# Altium footprint library terminal_blocks.PcbLib: 74 footprints (part 1 of 5)
Each footprint in its own frame and in the unit in brackets; x right, y up, seen from the top. Pads: shape width x height; smd on the part's side, far side on the other; paste and mask are expansions set on the pad; w line width, h text height; cw(c..) or ccw(c..) is an arc to the next point about the centre after c.
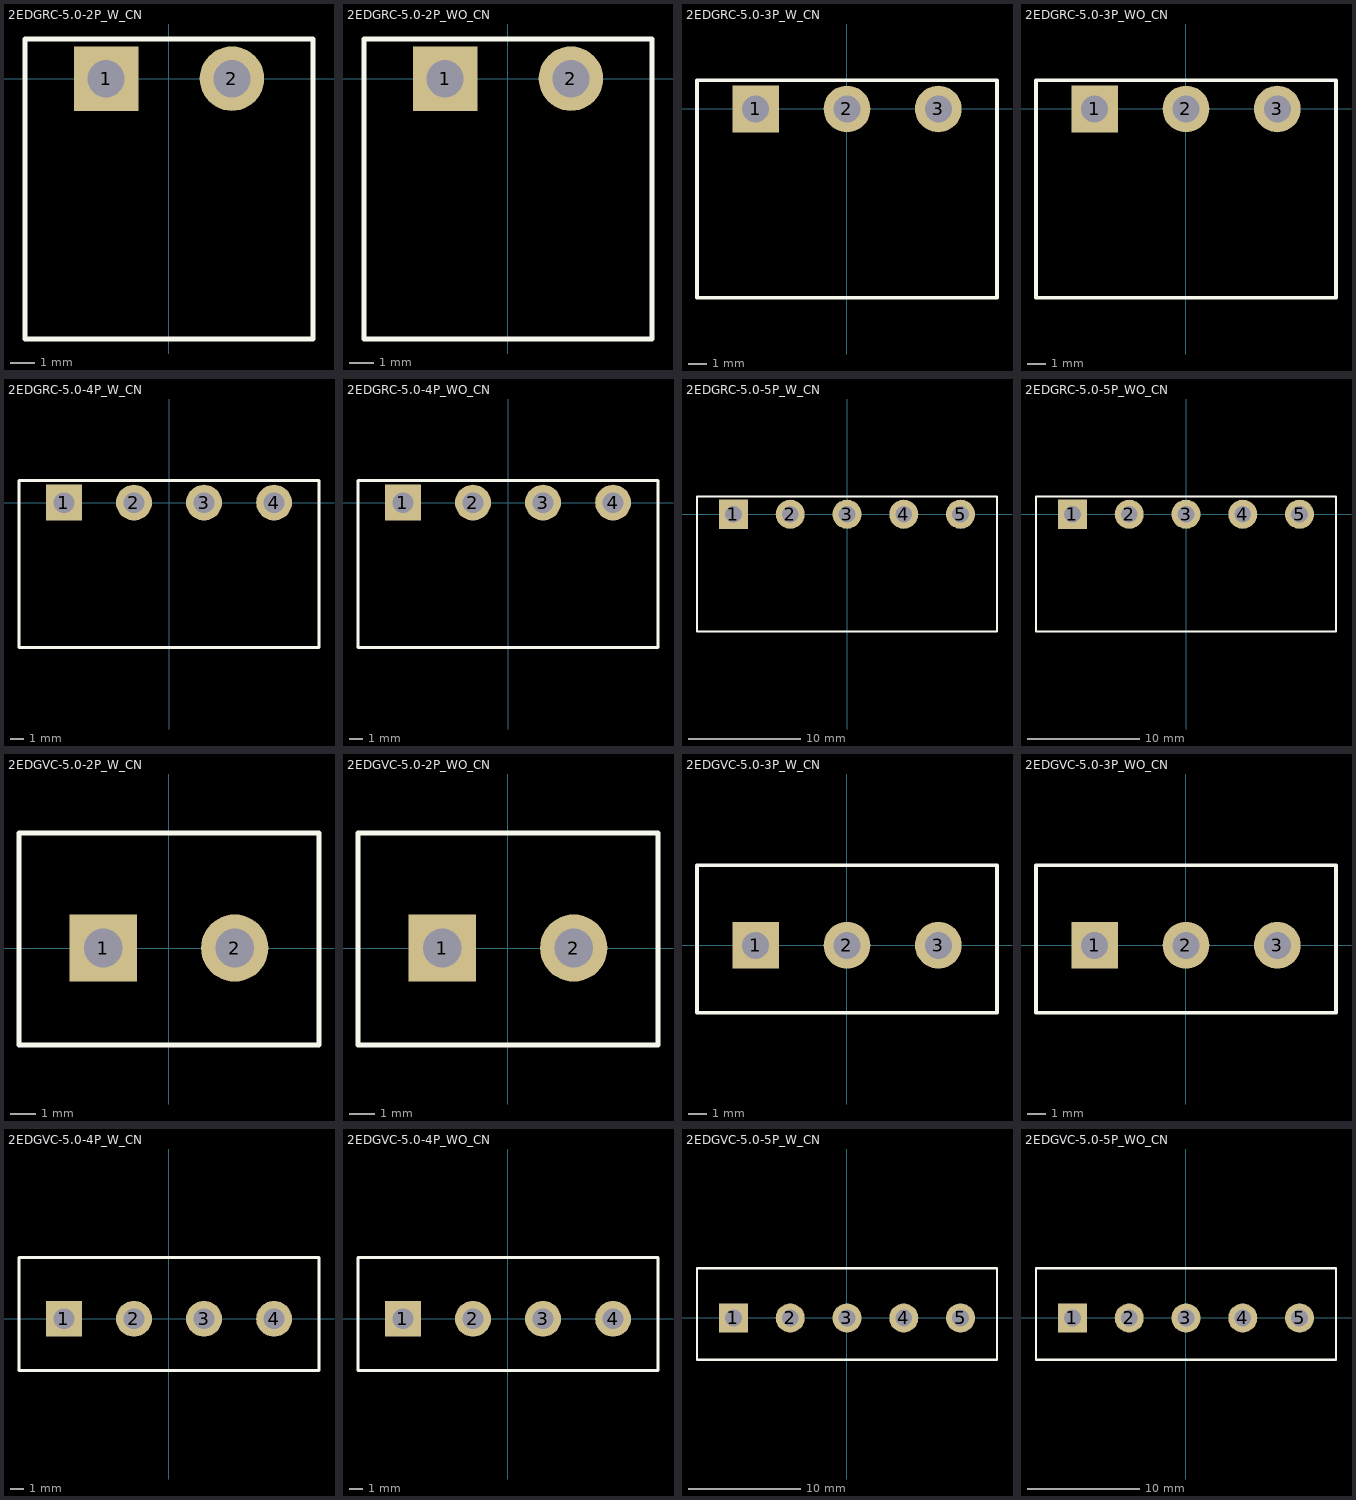
[diagram p0: the footprints below, top view; thin cyan lines are the x and y axes]

## 2EDGRC-5.0-2P_W_CN [mm] "Degson 20A, 320V, 2 Pole Plug-in Terminal Block"
height 8.2
pads (2):
  rect 2.6x2.6 hole 1.5: 1(-2.54,0)
  round 2.6 hole 1.5: 2(2.54,0)
Top Overlay:
  lines w0.2: -5.8,-10.5 5.8,-10.5 5.8,1.6 -5.8,1.6 -5.8,-10.5
3D body "2EDG-5.08-02P__.STEP": height 15.31, standoff 0.21, extent -5.08,-19.63 5.08,-2.3
3D body "ndz6.STEP": height 8.2, standoff -2.12, extent -5.78,-10.5 5.78,1.6

## 2EDGRC-5.0-2P_WO_CN [mm] "Degson 20A, 320V, 2 Pole Plug-in Terminal Block"
height 8.2
pads (2):
  rect 2.6x2.6 hole 1.5: 1(-2.54,0)
  round 2.6 hole 1.5: 2(2.54,0)
Top Overlay:
  lines w0.2: -5.8,-10.5 5.8,-10.5 5.8,1.6 -5.8,1.6 -5.8,-10.5
3D body "ndz6.STEP": height 8.2, standoff -2.12, extent -5.76,-10.5 5.8,1.6

## 2EDGRC-5.0-3P_W_CN [mm] "Degson 20A, 320V, 3 Pole Plug-in Terminal Block"
height 8.2
pads (3):
  rect 2.6x2.6 hole 1.5: 1(-5.08,0)
  round 2.6 hole 1.5: 2(0,0) 3(5.08,0)
Top Overlay:
  lines w0.2: -8.34,-10.5 8.34,-10.5 8.34,1.6 -8.34,1.6 -8.34,-10.5
3D body "Czêœæ23.STEP": height 8.2, standoff -3.12, extent -8.32,-10.5 8.32,1.6
3D body "2EDG-5.08-03P__.STEP": height 15.31, standoff 0.21, extent -7.62,-19.63 7.62,-2.3

## 2EDGRC-5.0-3P_WO_CN [mm] "Degson 20A, 320V, 3 Pole Plug-in Terminal Block"
height 8.2
pads (3):
  rect 2.6x2.6 hole 1.5: 1(-5.08,0)
  round 2.6 hole 1.5: 2(0,0) 3(5.08,0)
Top Overlay:
  lines w0.2: -8.34,-10.5 -8.34,1.6 8.34,1.6 8.34,-10.5 -8.34,-10.5
3D body "Czêœæ23.STEP": height 8.2, standoff -3.12, extent -8.32,-10.5 8.32,1.6

## 2EDGRC-5.0-4P_W_CN [mm] "Degson 20A, 320V, 4 Pole Plug-in Terminal Block"
height 8.2
pads (4):
  rect 2.6x2.6 hole 1.5: 1(-7.62,0)
  round 2.6 hole 1.5: 2(-2.54,0) 3(2.54,0) 4(7.62,0)
Top Overlay:
  lines w0.2: -10.88,-10.5 10.88,-10.5 10.88,1.6 -10.88,1.6 -10.88,-10.5
3D body "2EDG-5.08-04P__.STEP": height 15.31, standoff 0.21, extent -10.16,-19.63 10.16,-2.3
3D body "Czesc.STEP": height 8.44, standoff -3.12, extent -10.86,-10.5 10.86,1.6

## 2EDGRC-5.0-4P_WO_CN [mm] "Degson 20A, 320V, 4 Pole Plug-in Terminal Block"
height 8.2
pads (4):
  rect 2.6x2.6 hole 1.5: 1(-7.62,0)
  round 2.6 hole 1.5: 2(-2.54,0) 3(2.54,0) 4(7.62,0)
Top Overlay:
  lines w0.2: -10.88,-10.5 -10.88,1.6 10.88,1.6 10.88,-10.5 -10.88,-10.5
3D body "Czesc.STEP": height 8.44, standoff -3.12, extent -10.86,-10.5 10.86,1.6

## 2EDGRC-5.0-5P_W_CN [mm] "Degson 20A, 320V, 5 Pole Plug-in Terminal Block"
height 8.2
pads (5):
  rect 2.6x2.6 hole 1.5: 1(-10.16,0)
  round 2.6 hole 1.5: 2(-5.08,0) 3(0,0) 4(5.08,0) 5(10.16,0)
Top Overlay:
  lines w0.2: 13.41,-10.5 -13.42,-10.5 -13.42,1.6 13.41,1.6 ; 13.42,-10.5 13.42,1.6
3D body "Czêœæ30.STEP": height 8.44, standoff -3.12, extent -13.4,-10.5 13.4,1.6
3D body "2EDG-5.08-05P__.STEP": height 15.31, standoff 0.21, extent -12.7,-19.63 12.7,-2.3

## 2EDGRC-5.0-5P_WO_CN [mm] "Degson 20A, 320V, 5 Pole Plug-in Terminal Block"
height 8.2
pads (5):
  rect 2.6x2.6 hole 1.5: 1(-10.16,0)
  round 2.6 hole 1.5: 2(-5.08,0) 3(0,0) 4(5.08,0) 5(10.16,0)
Top Overlay:
  lines w0.2: 13.41,-10.5 -13.42,-10.5 -13.42,1.6 13.41,1.6 ; 13.42,-10.5 13.42,1.6
3D body "Czêœæ30.STEP": height 8.44, standoff -3.12, extent -13.4,-10.5 13.4,1.6

## 2EDGVC-5.0-2P_W_CN [mm] "Degson 20A, 320V, 2 Pole Plug-in Terminal Block"
height 8.2
pads (2):
  rect 2.6x2.6 hole 1.5: 1(-2.54,0)
  round 2.6 hole 1.5: 2(2.54,0)
Top Overlay:
  lines w0.2: -5.8,-3.75 5.8,-3.75 5.8,4.45 -5.8,4.45 -5.8,-3.75
3D body "2EDG-5.08-02P.STEP": height 21.08, standoff -4, extent -5.78,-3.7 5.78,11.91

## 2EDGVC-5.0-2P_WO_CN [mm] "Degson 20A, 320V, 2 Pole Plug-in Terminal Block"
height 8.2
pads (2):
  rect 2.6x2.6 hole 1.5: 1(-2.54,0)
  round 2.6 hole 1.5: 2(2.54,0)
Top Overlay:
  lines w0.2: -5.8,-3.75 -5.8,4.45 5.8,4.45 5.8,-3.75 -5.8,-3.75
3D body "2EDG-5.08-02P_.STEP": height 12.1, standoff -4, extent -5.78,-3.7 5.78,4.5

## 2EDGVC-5.0-3P_W_CN [mm] "Degson 20A, 320V, 3 Pole Plug-in Terminal Block"
height 8.2
pads (3):
  rect 2.6x2.6 hole 1.5: 1(-5.08,0)
  round 2.6 hole 1.5: 2(0,0) 3(5.08,0)
Top Overlay:
  lines w0.2: 8.31,-3.75 -8.34,-3.75 -8.34,4.45 8.335,4.45 8.34,4.445 8.34,-3.75
3D body "2EDG-5.08-03P.STEP": height 21.08, standoff -4, extent -8.32,-3.75 8.32,11.86

## 2EDGVC-5.0-3P_WO_CN [mm] "Degson 20A, 320V, 3 Pole Plug-in Terminal Block"
height 8.2
pads (3):
  rect 2.6x2.6 hole 1.5: 1(-5.08,0)
  round 2.6 hole 1.5: 2(0,0) 3(5.08,0)
Top Overlay:
  lines w0.2: 8.31,-3.75 -8.34,-3.75 -8.34,4.45 8.335,4.45 8.34,4.445 8.34,-3.75
3D body "2EDG-5.08-03P_.STEP": height 12.1, standoff -4, extent -8.32,-3.75 8.32,4.45

## 2EDGVC-5.0-4P_W_CN [mm] "Degson 20A, 320V, 4 Pole Plug-in Terminal Block"
height 8.2
pads (4):
  rect 2.6x2.6 hole 1.5: 1(-7.62,0)
  round 2.6 hole 1.5: 2(-2.54,0) 3(2.54,0) 4(7.62,0)
Top Overlay:
  lines w0.2: 10.86,-3.75 -10.88,-3.75 -10.88,4.45 10.86,4.45 ; 10.88,-3.75 10.88,4.445
3D body "2EDG-5.08-04P.STEP": height 21.08, standoff -4, extent -10.86,-3.75 10.86,11.86

## 2EDGVC-5.0-4P_WO_CN [mm] "Degson 20A, 320V, 4 Pole Plug-in Terminal Block"
height 8.2
pads (4):
  rect 2.6x2.6 hole 1.5: 1(-7.62,0)
  round 2.6 hole 1.5: 2(-2.54,0) 3(2.54,0) 4(7.62,0)
Top Overlay:
  lines w0.2: 10.86,-3.75 -10.88,-3.75 -10.88,4.45 10.86,4.45 ; 10.88,-3.75 10.88,4.445
3D body "2EDG-5.08-04P_.STEP": height 12.1, standoff -4, extent -10.86,-3.75 10.86,4.45

## 2EDGVC-5.0-5P_W_CN [mm] "Degson 20A, 320V, 5 Pole Plug-in Terminal Block"
height 8.2
pads (5):
  rect 2.6x2.6 hole 1.5: 1(-10.16,0)
  round 2.6 hole 1.5: 2(-5.08,0) 3(0,0) 4(5.08,0) 5(10.16,0)
Top Overlay:
  lines w0.2: 13.41,-3.75 -13.42,-3.75 -13.42,4.45 13.41,4.45 ; 13.42,-3.75 13.42,4.445
3D body "2EDG-5.08-05P.STEP": height 21.08, standoff -4, extent -13.4,-3.75 13.4,11.86

## 2EDGVC-5.0-5P_WO_CN [mm] "Degson 20A, 320V, 5 Pole Plug-in Terminal Block"
height 8.2
pads (5):
  rect 2.6x2.6 hole 1.5: 1(-10.16,0)
  round 2.6 hole 1.5: 2(-5.08,0) 3(0,0) 4(5.08,0) 5(10.16,0)
Top Overlay:
  lines w0.2: 13.41,-3.75 -13.42,-3.75 -13.42,4.45 13.41,4.45 ; 13.42,-3.75 13.42,4.445
3D body "2EDG-5.08-05P_.STEP": height 12.1, standoff -4, extent -13.4,-3.75 13.4,4.45